# Altium footprint library bspd parts.PcbLib: 57 footprints (part 4 of 4)
Each footprint in its own frame and in the unit in brackets; x right, y up, seen from the top. Pads: shape width x height; smd on the part's side, far side on the other; paste and mask are expansions set on the pad; w line width, h text height; cw(c..) or ccw(c..) is an arc to the next point about the centre after c.
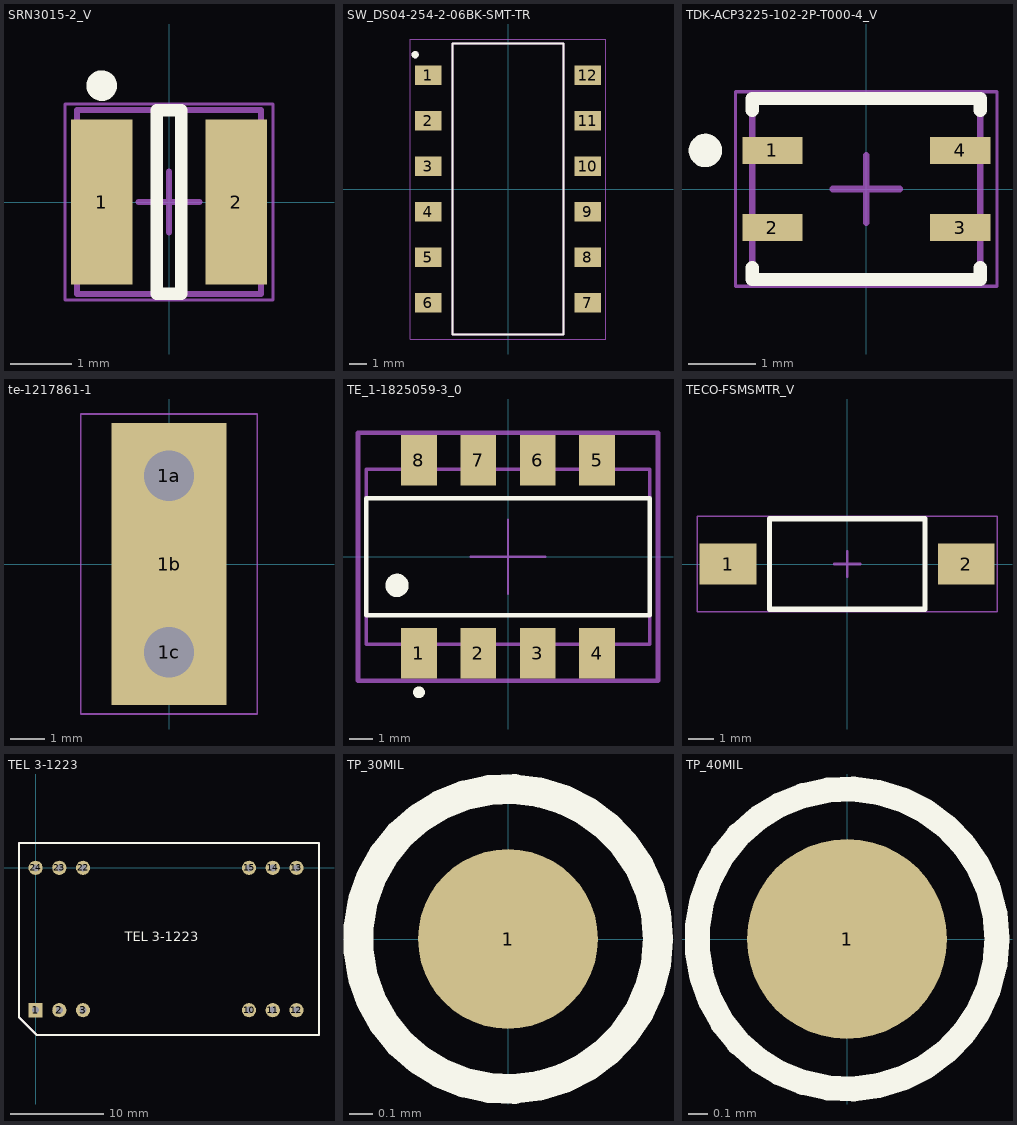
[diagram p3: the footprints below, top view; thin cyan lines are the x and y axes]

## SRN3015-2_V [mm] "SMD, 2-Leads, Body 3x3mm, Height 1.5mm"
height 1.5
pads (2):
  rect 1x2.7 smd: 1(-1.1,0) 2(1.1,0)
Top Overlay:
  circle w0.25: c-1.1,1.9 r0.125
  lines w0.2: -0.2,-1.5 -0.2,1.5 0.2,1.5 0.2,-1.5 -0.2,-1.5
Mechanical 13:
  lines w0.1: -1.5,-1.5 -1.5,1.5 1.5,1.5 1.5,-1.5 -1.5,-1.5
Mechanical 15:
  lines w0.05: -1.7,-1.6 -1.7,1.6 1.7,1.6 1.7,-1.6 -1.7,-1.6
  lines w0.1: -0.5,0 0.5,0 ; 0,-0.5 0,0.5
3D body "srn3015.stp": height 1.5, standoff 0, extent -1.5,-1.5 1.5,1.5

## SW_DS04-254-2-06BK-SMT-TR [mm]
pads (12):
  rect 1.5x1.1 smd: 1(-4.45,6.35) 2(-4.45,3.81) 3(-4.45,1.27) 4(-4.45,-1.27) 5(-4.45,-3.81) 6(-4.45,-6.35) 7(4.45,-6.35) 8(4.45,-3.81) 9(4.45,-1.27) 10(4.45,1.27) 11(4.45,3.81) 12(4.45,6.35)
Top Overlay:
  circle w0.2: c-5.18,7.493 r0.1
  lines w0.127: -3.1,-8.12 -3.1,8.12 3.1,8.12 3.1,-8.12 -3.1,-8.12
Top 3D Body:
  circle w0.2: c-5.18,7.493 r0.1
  circle w0.2: c-5.18,7.493 r0.1
  lines w0.127: -3.1,-8.12 -3.1,8.12 ; -3.1,-8.12 3.1,-8.12 ; -3.1,-8.12 -3.1,8.12 ; -3.1,-8.12 3.1,-8.12 ; -3.1,8.12 3.1,8.12 ; -3.1,8.12 3.1,8.12 ; 3.1,-8.12 3.1,8.12 ; 3.1,-8.12 3.1,8.12
Bottom Component Outline:
  lines w0.05: -5.45,-8.37 5.45,-8.37 5.45,8.37 -5.45,8.37 -5.45,-8.37
3D body "CUI_DEVICES_DS04-254-2-06BK-SMT-TR.step": height 3.96, standoff -0.04, extent -4.95,-8.12 4.95,8.12

## TDK-ACP3225-102-2P-T000-4_V [mm] "SMD, 4-Leads, Body 3.4x2.7mm"
height 2
pads (4):
  rect 0.9x0.4 smd: 1(-1.4,0.575) 2(-1.4,-0.575) 3(1.4,-0.575) 4(1.4,0.575)
Top Overlay:
  circle w0.25: c-2.4,0.575 r0.125
  lines w0.2: -1.7,-1.175 -1.7,-1.35 1.7,-1.35 1.7,-1.175 ; -1.7,1.175 -1.7,1.35 1.7,1.35 1.7,1.175
Mechanical 13:
  lines w0.1: -1.7,-1.35 -1.7,1.35 1.7,1.35 1.7,-1.35 -1.7,-1.35
Mechanical 15:
  lines w0.05: -1.95,-1.45 -1.95,1.45 1.95,1.45 1.95,-1.45 -1.95,-1.45
  lines w0.1: -0.5,0 0.5,0 ; 0,-0.5 0,0.5
3D body "acp3225.step": height 1.92, standoff 0.02, extent -1.599,-1.257 1.601,1.243

## te-1217861-1 [mil]
pads (3):
  round 100 hole 57: 1a(0,100) 1c(0,-100)
  rect 130x320 smd paste-39370.1 mask+4: 1b(0,0)
Top Solder:
  rectangle: 20,-60 65,-5
  rectangle: -65,5 -20,60
Top 3D Body:
  lines w2: -100,-170 100,-170 100,170 0,170 -100,170 -100,-170
3D body "c-1217861-1-h-3d.stp": height 415, standoff -137, extent -61.49,-156 60,156

## TE_1-1825059-3_0 [mil]
pads (8):
  rect 60x85 smd: 1(-150,-162.5) 2(-50,-162.5) 3(50,-162.5) 4(150,-162.5) 5(150,162.5) 6(50,162.5) 7(-50,162.5) 8(-150,162.5)
Top Overlay:
  circle w19.68: c-187.01,-48.23 r9.84
  circle w9.84: c-150,-228.35 r4.92
  lines w7.87: -238.98,-98.43 -238.98,98.43 238.98,98.43 238.98,-98.43 -238.98,-98.43
Mechanical 10:
  lines w7.87: -252.76,-208.94 -252.76,208.94 252.76,208.94 252.76,-208.94 -252.76,-208.94
  text ".Designator" at 0,0 h39.37
Mechanical 12:
  lines w5.91: -238.98,-147.64 -238.98,147.64 238.98,147.64 238.98,-147.64 -238.98,-147.64
Mechanical 15:
  lines w3.94: -62.68,0 62.68,0 ; 0,-62.68 0,62.68
  lines w7.87: -252.76,-208.94 -252.76,208.94 252.76,208.94 252.76,-208.94 -252.76,-208.94
3D body "c-1-1825059-3-a-3d.STEP": height 175, standoff 0.2, extent -238.98,-183.41 238.98,183.41

## TECO-FSMSMTR_V [mm] "SMD, 2-Leads, Body 6x3.5mm, Pitch 9.19mm"
height 4.57
pads (2):
  rect 2.2x1.6 smd: 1(-4.595,0)
  rect 2.18x1.6 smd: 2(4.595,0)
Top Overlay:
  lines w0.2: -3,-1.75 3,-1.75 3,1.75 -3,1.75 -3,-1.75
Mechanical 13:
  lines w0.1: -3,-1.75 -3,1.75 3,1.75 3,-1.75 -3,-1.75
Mechanical 15:
  lines w0.05: -5.795,-1.85 5.785,-1.85 5.785,1.85 -5.795,1.85 -5.795,-1.85
  lines w0.1: -0.5,0 0.5,0 ; 0,-0.5 0,0.5
3D body "c-1437566-4-c-3d.STEP": height 4.4, standoff -0.02, extent -4.984,-1.75 4.985,1.75

## TEL 3-1223 [mil]
pads (12):
  rect 60x60 hole 30: 1(0,-600)
  round 60 hole 30: 2(100,-600) 3(200,-600) 10(900,-600) 11(1000,-600) 12(1100,-600) 13(1100,0) 14(1000,0) 15(900,0) 22(200,0) 23(100,0) 24(0,0)
Top Overlay:
  lines w10: -70,-630 5,-705 1195,-705 1195,105 -70,105 -70,-630
  text "TEL 3-1223" at 375,-310 h40
Top Component Outline:
  lines w10: -70,-630 -70,105 1195,105 1195,-705 5,-705 -70,-630
3D body "tel3.STEP": height 402, standoff -178.71, extent -60,-697.28 1188.03,98

## TP_30MIL [mil]
pads (1):
  round 30 smd paste-100: 1(0,0)
Top Overlay:
  circle w5: c0,0 r25

## TP_40MIL [mil]
pads (1):
  round 40 smd paste-100: 1(0,0)
Top Overlay:
  circle w5: c0,0 r30